# Altium footprint library custom.PcbLib: 317 footprints (part 16 of 20)
Each footprint in its own frame and in the unit in brackets; x right, y up, seen from the top. Pads: shape width x height; smd on the part's side, far side on the other; paste and mask are expansions set on the pad; w line width, h text height; cw(c..) or ccw(c..) is an arc to the next point about the centre after c.
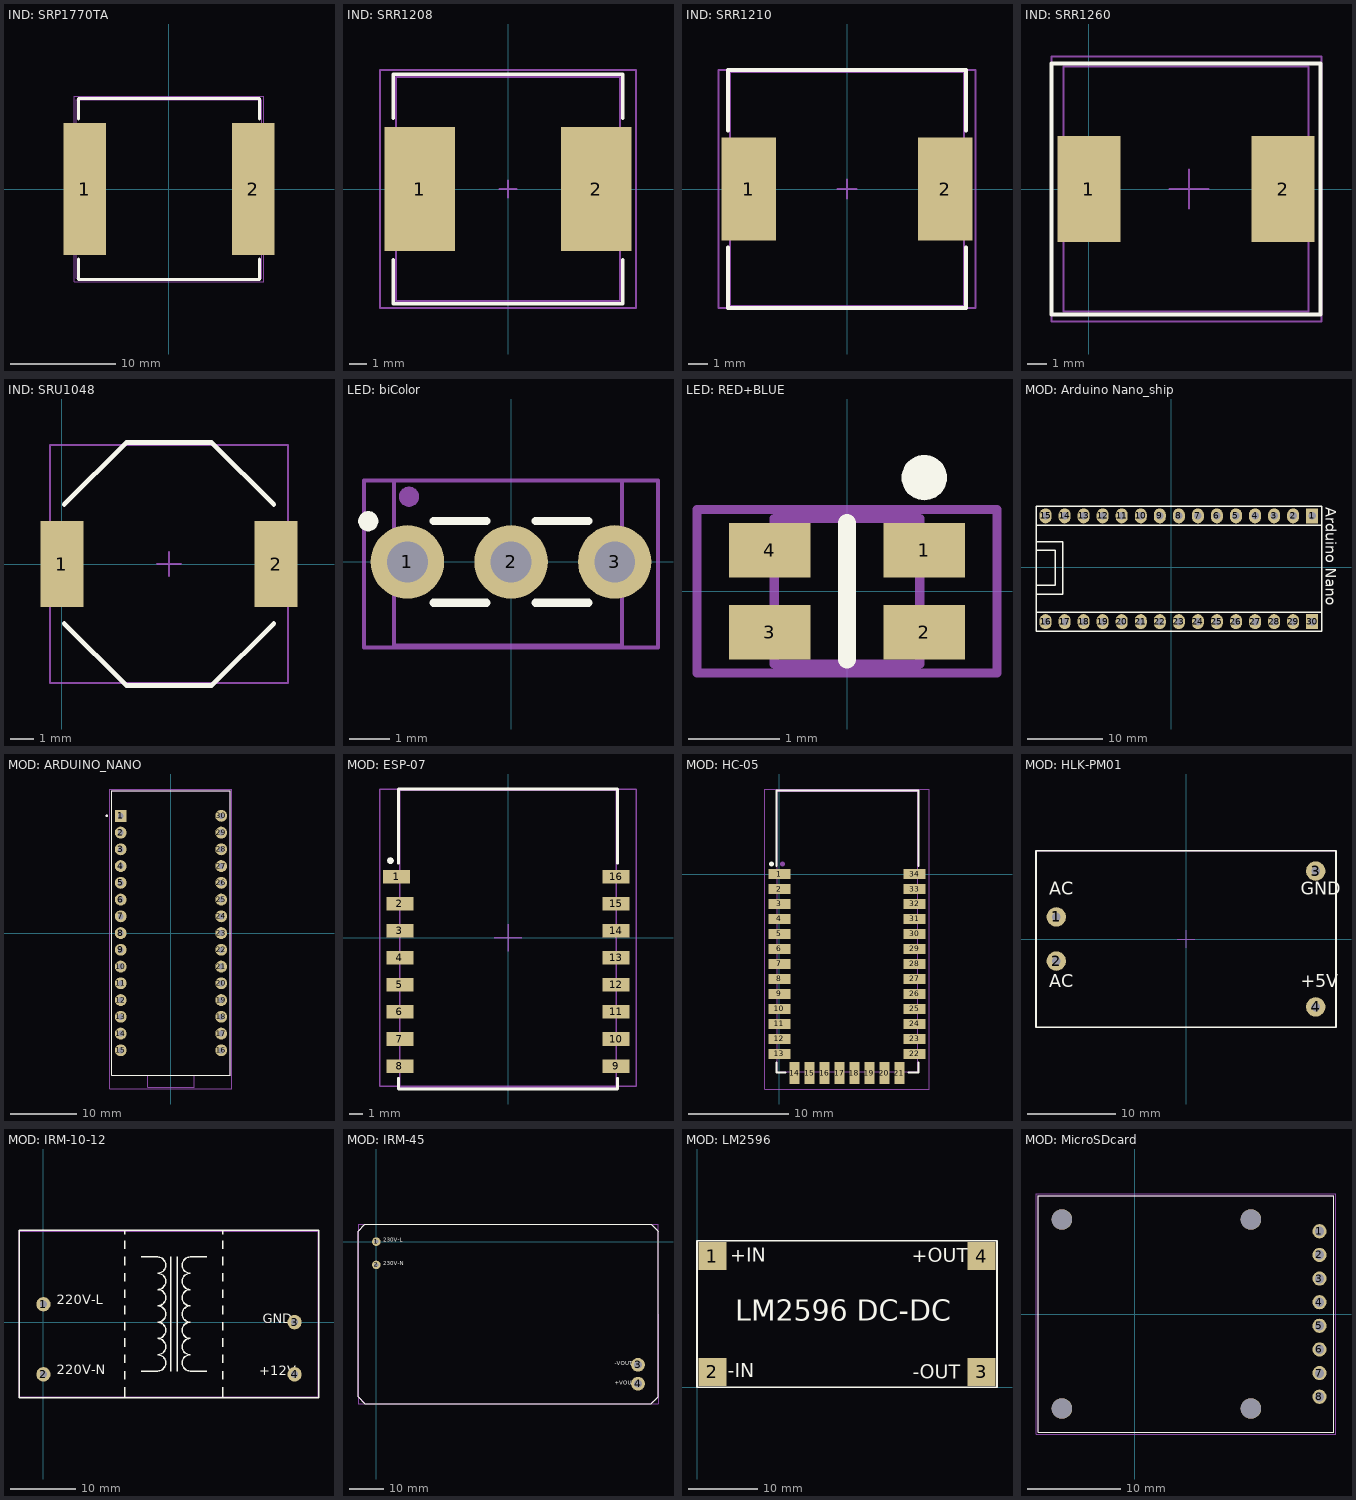
[diagram p15: the footprints below, top view; thin cyan lines are the x and y axes]

## IND: SRP1770TA [mm] "SMD inductor, 17x17x7 mm"
height 7
pads (2):
  rect 4x12.5 smd: 1(-8,0) 2(8,0)
Top Overlay:
  lines w0.254: -8.6,-6.65 -8.6,-8.6 8.6,-8.6 8.6,-6.65 ; -8.6,6.65 -8.6,8.6 8.6,8.6 8.6,6.65
Top Assy:
  lines w0.1: -8.8,-8.5 8.8,-8.5 8.8,8.5 -8.8,8.5 -8.8,-8.5
Size Area:
  lines w0.05: -9,-8.8 9,-8.8 9,8.8 -9,8.8 -9,-8.8
3D body "SRP1770TA.stp": height 6.81, standoff 0, extent -8.85,-8.5 9.05,8.4

## IND: SRR1208 [mm]
pads (2):
  rect 4x7 smd: 1(-5,0) 2(5,0)
Top Overlay:
  lines w0.2: -6.5,-4 -6.5,-6.5 6.5,-6.5 6.5,-4 ; -6.5,4 -6.5,6.5 6.5,6.5 6.5,4
Top Assy:
  lines w0.1: -6.35,-6.35 -6.35,6.35 6.35,6.35 6.35,-6.35 -6.35,-6.35
Size Area:
  lines w0.1: -0.5,0 0.5,0 ; 0,-0.5 0,0.5 ; -7.25,-6.75 7.25,-6.75 7.25,6.75 -7.25,6.75 -7.25,-6.75
3D body "User Library-SRR1208.STEP": height 8.5, standoff 0.01, extent -6.35,-6.35 6.35,6.35

## IND: SRR1210 [mm]
pads (2):
  rect 2.8x5.3 smd: 1(-5.05,0) 2(5.05,0)
Top Overlay:
  lines w0.2: -6.1,-3 -6.1,-6.1 6.1,-6.1 6.1,-3 ; -6.1,3 -6.1,6.1 6.1,6.1 6.1,3
Top Assy:
  lines w0.1: -6,-6 -6,6 6,6 6,-6 -6,-6
Size Area:
  lines w0.1: -0.5,0 0.5,0 ; 0,-0.5 0,0.5 ; -6.6,-6.1 6.6,-6.1 6.6,6.1 -6.6,6.1 -6.6,-6.1
3D body "User Library-SRR1210_inductor.STEP": height 10.37, standoff 0.01, extent -6,-6 6,6

## IND: SRR1260 [mm]
pads (2):
  rect 3.2x5.4 smd: 1(0,0) 2(9.9,0)
Top Overlay:
  lines w0.2: -1.9,-6.4 11.8,-6.4 11.8,6.4 -1.9,6.4 -1.9,-6.4
Top Assy:
  lines w0.1: -1.3,-6.25 -1.3,6.25 11.2,6.25 11.2,-6.25 -1.3,-6.25
Size Area:
  lines w0.1: 4.1,0 6.1,0 ; 5.1,-1 5.1,1 ; -1.9,-6.75 -1.9,6.75 11.85,6.75 11.85,-6.75 -1.9,-6.75
3D body "SW3dPS-DRQ127_12.5x12.5.STEP": height 8, standoff 0, extent -1.3,-6.25 11.2,6.25

## IND: SRU1048 [mm]
pads (2):
  rect 1.8x3.6 smd: 1(0,0) 2(9,0)
Top Overlay:
  lines w0.2: 0.1,-2.5 2.7,-5.1 6.3,-5.1 8.9,-2.5 ; 0.1,2.5 2.7,5.1 6.3,5.1 8.9,2.5
Top Assy:
  lines w0.1: -0.5,-5 -0.5,5 9.5,5 9.5,-5 -0.5,-5
Size Area:
  lines w0.1: 4,0 5,0 ; 4.5,-0.5 4.5,0.5 ; -0.5,-5 -0.5,5 9.5,5 9.5,-5 -0.5,-5
3D body "sru1048.stp": height 4.82, standoff 0, extent -0.5,-5 9.5,5

## LED: biColor [mm]
pads (5):
  round 1.8 hole 1: 1(-2.54,0) 2(0,0) 3(2.54,0)
  round 0.5 on Top Overlay: ""(-3.5,1)
  round 0.5 on Mech1: ""(-2.5,1.6)
Top Overlay:
  lines w0.2: -1.9,-1 -0.6,-1 ; -1.9,1 -0.6,1 ; 0.6,-1 1.9,-1 ; 0.6,1 1.9,1
Top Assy:
  lines w0.1: -2.869,-2.05 2.719,-2.05 2.719,1.998 -2.869,1.998 -2.869,-2.05
Size Area:
  lines w0.1: -0.5,0 0.5,0 ; 0,-0.5 0,0.5 ; -3.6,-2.1 -3.6,2 3.6,2 3.6,-2.1 -3.6,-2.1
3D body "biLED.STEP": height 10.21, standoff -2.75, extent -2.869,-2.05 2.719,1.998

## LED: RED+BLUE [mm]
pads (5):
  rect 0.9x0.6 smd: 1(0.85,0.45) 2(0.85,-0.45) 3(-0.85,-0.45) 4(-0.85,0.45)
  round 0.5 on Top Overlay: ""(0.85,1.25)
Top Overlay:
  lines w0.2: 0,-0.75 0,0.75
Top Assy:
  lines w0.1: -0.8,0.8 0.8,0.8 ; -0.8,0.8 -0.8,-0.8 0.8,-0.8 ; -0.8,0.8 -0.8,0.8 ; 0.8,-0.8 0.8,0.8 ; 0.8,-0.8 0.8,-0.8 ; 0.8,0.8 0.8,0.8
Size Area:
  lines w0.1: -1.65,-0.9 1.65,-0.9 1.65,0.9 -1.65,0.9 -1.65,-0.9
3D body "User Library-LED_0603_R.STEP": height 0.55, standoff -0.05, extent -0.8,0 0.8,0.8
3D body "User Library-LED_0603_B.STEP": height 0.55, standoff -0.05, extent -0.8,-0.8 0.8,0

## MOD: Arduino Nano_ship [mm]
pads (30):
  rect 1.6x2 hole 1: 1(18.796,6.858) 30(18.796,-7.239)
  oval 1.6x2 hole 1: 2(16.256,6.858) 3(13.716,6.858) 4(11.176,6.858) 5(8.636,6.858) 6(6.096,6.858) 7(3.556,6.858) 8(1.016,6.858) 9(-1.524,6.858) 10(-4.064,6.858) 11(-6.604,6.858) 12(-9.144,6.858) 13(-11.684,6.858) 14(-14.224,6.858) 15(-16.764,6.858) 16(-16.764,-7.239) 17(-14.224,-7.239) 18(-11.684,-7.239) 19(-9.144,-7.239) 20(-6.604,-7.239) 21(-4.064,-7.239) 22(-1.524,-7.239) 23(1.016,-7.239) 24(3.556,-7.239) 25(6.096,-7.239) 26(8.636,-7.239) 27(11.176,-7.239) 28(13.716,-7.239) 29(16.256,-7.239)
Top Overlay:
  lines w0.2: -18.034,-7.493 -18.034,6.858 ; -18.034,-3.429 -18.034,-3.556 -14.478,-3.556 -14.478,3.429 -18.034,3.429 ; -18.034,-2.413 -15.494,-2.413 -15.494,2.286 -18.034,2.286 ; 20.066,-8.128 20.066,8.001 ; -18.034,-8.509 -18.034,-5.969 20.066,-5.969 20.066,-8.509 18.161,-8.509 -18.034,-8.509 ; -18.034,5.588 -18.034,8.128 20.066,8.128 20.066,5.588 18.161,5.588 -18.034,5.588
  text "Arduino Nano" at 20.574,8.001 h1.4

## MOD: ARDUINO_NANO [mm]
pads (30):
  rect 1.8x1.8 / inner round 1.8 / far side rect 1.8x1.8 hole 0.9: 1(-7.62,17.78)
  round 1.8 hole 0.9: 2(-7.62,15.24) 3(-7.62,12.7) 4(-7.62,10.16) 5(-7.62,7.62) 6(-7.62,5.08) 7(-7.62,2.54) 8(-7.62,0) 9(-7.62,-2.54) 10(-7.62,-5.08) 11(-7.62,-7.62) 12(-7.62,-10.16) 13(-7.62,-12.7) 14(-7.62,-15.24) 15(-7.62,-17.78) 16(7.62,-17.78) 17(7.62,-15.24) 18(7.62,-12.7) 19(7.62,-10.16) 20(7.62,-7.62) 21(7.62,-5.08) 22(7.62,-2.54) 23(7.62,0) 24(7.62,2.54) 25(7.62,5.08) 26(7.62,7.62) 27(7.62,10.16) 28(7.62,12.7) 29(7.62,15.24) 30(7.62,17.78)
Top Overlay:
  circle w0.2: c-9.75,17.78 r0.1
  lines w0.127: -9,-21.6 -9,21.6 9,21.6 9,-21.6 -9,-21.6
3D model:
  circle w0.2: c-9.75,17.78 r0.1
  lines w0.127: -3.5,-21.6 -3.5,-23.4 3.5,-23.4 3.5,-21.6 ; -3.5,-21.6 -9,-21.6 -9,21.6 9,21.6 9,-21.6 3.5,-21.6 ; -3.5,-21.6 3.5,-21.6
Size Area:
  lines w0.05: -9.25,-23.65 9.25,-23.65 9.25,21.85 -9.25,21.85 -9.25,-23.65
3D body "step_temp.STEP": height 12.6, standoff -6, extent -9,-23.4 9,21.6

## MOD: ESP-07 [mm]
pads (17):
  rect 2x1 smd: 1(-8.25,4.5) 2(-8,2.5) 3(-8,0.5) 4(-8,-1.5) 5(-8,-3.5) 6(-8,-5.5) 7(-8,-7.5) 8(-8,-9.5) 9(8,-9.5) 10(8,-7.5) 11(8,-5.5) 12(8,-3.5) 13(8,-1.5) 14(8,0.5) 15(8,2.5) 16(8,4.5)
  round 0.5 on Top Overlay: ""(-8.7,5.7)
Top Overlay:
  lines w0.2: -8.1,-10.4 -8.1,-11.2 8.1,-11.2 8.1,-10.4 ; -8.1,5.5 -8.1,10.9 -8.1,11 8.1,11 8.1,5.5
Top Assy:
  lines w0.1: -8,-11.1 -8,10.9 8,10.9 8,-11.1 -8,-11.1
Size Area:
  lines w0.1: -1,0 1,0 ; 0,-1 0,1 ; -9.5,-11 9.5,-11 9.5,11 -9.5,11 -9.5,-11
3D body "User Library-ESP07-1.STEP": height 3.5, standoff -0.01, extent -8,-11.1 8,10.9

## MOD: HC-05 [mm] "Bluetooth 2.0 module"
height 2
pads (36):
  rect 2.2x1 smd: 1(0,0) 2(0,-1.5) 3(0,-3) 4(0,-4.5) 5(0,-6) 6(0,-7.5) 7(0,-9) 8(0,-10.5) 9(0,-12) 10(0,-13.5) 11(0,-15) 12(0,-16.5) 13(0,-18) 22(13.5,-18) 23(13.5,-16.5) 24(13.5,-15) 25(13.5,-13.5) 26(13.5,-12) 27(13.5,-10.5) 28(13.5,-9) 29(13.5,-7.5) 30(13.5,-6) 31(13.5,-4.5) 32(13.5,-3) 33(13.5,-1.5) 34(13.5,0)
  rect 1x2.2 smd: 14(1.5,-19.9) 15(3,-19.9) 16(4.5,-19.9) 17(6,-19.9) 18(7.5,-19.9) 19(9,-19.9) 20(10.5,-19.9) 21(12,-19.9)
  round 0.5 on Mech1: 33(0.3,1)
  round 0.5 on Top Overlay: 34(-0.8,1)
Top Overlay:
  lines w0.2: -0.3,-18.875 -0.3,-19.85 0.625,-19.85 ; -0.3,0.8 -0.3,8.35 13.9,8.35 13.9,0.8 ; 12.875,-19.85 13.9,-19.85 13.9,-18.875
Top Assy:
  lines w0.1: -0.21,-19.76 13.81,-19.76 13.81,8.25 -0.21,8.25 -0.21,-19.76
Size Area:
  lines w0.1: -1.5,-21.5 -1.5,8.5 15,8.5 15,-21.5 -1.5,-21.5
3D body "HC-05.step": height 2.35, standoff 0, extent -0.21,-19.76 13.81,8.25

## MOD: HLK-PM01 [mm]
height 15
pads (4):
  round 2.2 hole 1: 1(-14.7,2.5) 2(-14.7,-2.5) 3(14.7,7.7) 4(14.7,-7.7)
Top Overlay:
  lines w0.2: -17,-10 -17,10 17,10 17,-10 0,-10 -17,-10
  text "GND" at 13,4.5 h2.5
  text "+5V" at 13,-6 h2.5
  text "AC" at -15.5,-6 h2.5
  text "AC" at -15.5,4.5 h2.5
Top Assy:
  lines w0.1: -17,-10 17,-10 17,10 -17,10 -17,-10
Size Area:
  lines w0.1: -1,0 1,0 ; 0,-1 0,1 ; -17,-10 17,-10 17,10 -17,10 -17,-10
3D body "HLK-PM01.STEP": height 15.03, standoff -4.99, extent -17,-10.1 17,10.1

## MOD: IRM-10-12 [mm]
pads (4):
  round 2.2 hole 1.1: 1(0,2.75) 2(0,-8) 3(38.5,0) 4(38.5,-8)
Top Overlay:
  lines w0.2: 12.5,-11.5 12.5,-10 ; 12.5,-8.75 12.5,-7.5 ; 12.5,-6.25 12.5,-5 ; 12.5,-3.75 12.5,-2.5 ; 12.5,-1.25 12.5,0 ; 12.5,1.25 12.5,2.5 ; 12.5,3.75 12.5,5 ; 12.5,6.25 12.5,7.5 ; 12.5,8.75 12.5,10 ; 12.5,11.25 12.5,12.5 ; 12.5,13.5 12.5,14 ; 15,-7.5 17.5,-7.5 ccw(c17.5,-6.25) 17.5,-5 ccw(c17.5,-3.75) 17.5,-2.5 ccw(c17.5,-1.25) 17.5,0 ccw(c17.5,1.25) 17.5,2.5 ccw(c17.5,3.75) 17.5,5 ccw(c17.5,6.25) 17.5,7.5 ccw(c17.5,8.75) 17.5,10 15,10 ; 19.5,-7.5 19.5,10 ; 20.5,-7.5 20.5,10 ; 25,-7.5 22.5,-7.5 cw(c22.5,-6.25) 22.5,-5 cw(c22.5,-3.75) 22.5,-2.5 cw(c22.5,-1.25) 22.5,0 cw(c22.5,1.25) 22.5,2.5 cw(c22.5,3.75) 22.5,5 cw(c22.5,6.25) 22.5,7.5 cw(c22.5,8.75) 22.5,10 25,10 ; 27.5,-11.5 27.5,-10 ; 27.5,-8.75 27.5,-7.5 ; 27.5,-6.25 27.5,-5 ; 27.5,-3.75 27.5,-2.5 ; 27.5,-1.25 27.5,0 ; 27.5,1.25 27.5,2.5 ; 27.5,3.75 27.5,5 ; 27.5,6.25 27.5,7.5 ; 27.5,8.75 27.5,10 ; 27.5,11.25 27.5,12.5 ; 27.5,13.5 27.5,14 ; -3.75,-11.6 -3.75,14.1 42.25,14.1 42.25,-11.6 -3.75,-11.6
  text "GND" at 33.6,-0.7 h2.5
  text "+12V" at 33.1,-8.7 h2.5
  text "220V-L" at 2,2.2 h2.5
  text "220V-N" at 2,-8.5 h2.5
Top Assy:
  lines w0.1: -3.6,-11.45 42.099,-11.45 42.099,13.95 -3.6,13.95 -3.6,-11.45
Size Area:
  lines w0.1: -3.7,-11.55 -3.7,14.05 42.2,14.05 42.2,-11.55 -3.7,-11.55
3D body "User Library-IRM-10-12.STEP": height 22.05, standoff -3.5, extent -3.6,-11.45 42.099,13.95

## MOD: IRM-45 [mm]
pads (4):
  round 2.5 hole 1.2: 1(0,0) 2(0,-6.75)
  round 4 hole 2.2: 3(76,-35.75) 4(76,-41.25)
Top Overlay:
  lines w0.2: -5.3,3 -5.3,-45.05 -3.3,-47.05 79.8,-47.05 81.8,-45.05 81.8,3 79.8,5 -3.3,5 -5.3,3 ; -5.3,3 -5.3,3
  text "-VOUT" at 69.25,-36.25 h2
  text "+VOUT" at 69.25,-42 h2
  text "230V-L" at 2,-0.5 h2
  text "230V-N" at 2,-7.25 h2
Top Assy:
  lines w0.1: -5.3,-45.05 -3.25,-47.1 79.75,-47.1 81.8,-45.05 81.8,3 79.8,5 -3.3,5 -5.3,3 -5.3,-45.05
  text "-VOUT" at 69.25,-36.25 h2
  text "+VOUT" at 69.25,-42 h2
  text "230V-N" at 2,-7.25 h2
  text "230V-L" at 2,-0.5 h2
Size Area:
  lines w0.1: -5.3,-47.1 -5.3,5.1 81.8,5.1 81.8,-47.1 -5.3,-47.1
3D body "IRM-45-15.step": height 29.51, standoff -3.5, extent -5.25,-47 81.75,5

## MOD: LM2596 [mm] "DC-DC"
pads (4):
  rect 4x4 smd: 1(2.2,18.8) 2(2.2,2.2) 3(40.8,2.2) 4(40.8,18.8)
Top Overlay:
  lines w0.254: 0,0 0,21 43,21 43,0 0,0
  text "LM2596 DC-DC" at 5.503,9.5 h3
  text "+IN" at 4.8,18 h2
  text "-IN" at 4.4,1.4 h2
  text "+OUT" at 30.8,17.9 h2
  text "-OUT" at 30.9,1.2 h2

## MOD: MicroSDcard [mm] "MicroSDcard"
pads (12):
  round 1.53 hole 1.02: 1(19.866,8.89) 2(19.866,6.35) 3(19.866,3.81) 4(19.866,1.27) 5(19.866,-1.27) 6(19.866,-3.81) 7(19.866,-6.35) 8(19.866,-8.89)
  round 2.2 hole 2.2 unplated: ""(-7.82,-10.16) ""(-7.82,10.16) ""(12.5,-10.16) ""(12.5,10.16)
Top Overlay:
  lines w0.127: -10.36,-12.7 -10.36,12.7 21.39,12.7 21.39,-12.7 -10.36,-12.7
3D model:
  lines w0.127: -10.36,-12.7 -10.36,12.7 21.39,12.7 21.39,-12.7 -10.36,-12.7
Size Area:
  lines w0.05: -10.61,-12.95 -10.61,12.95 21.64,12.95 21.64,-12.95 -10.61,-12.95
3D body "MicroSDcard.STEP": height 3.81, standoff 0, extent -10.35,-12.7 21.4,12.7